# Altium footprint library PcbLib_jp.PcbLib: 255 footprints (part 6 of 16)
Each footprint in its own frame and in the unit in brackets; x right, y up, seen from the top. Pads: shape width x height; smd on the part's side, far side on the other; paste and mask are expansions set on the pad; w line width, h text height; cw(c..) or ccw(c..) is an arc to the next point about the centre after c.
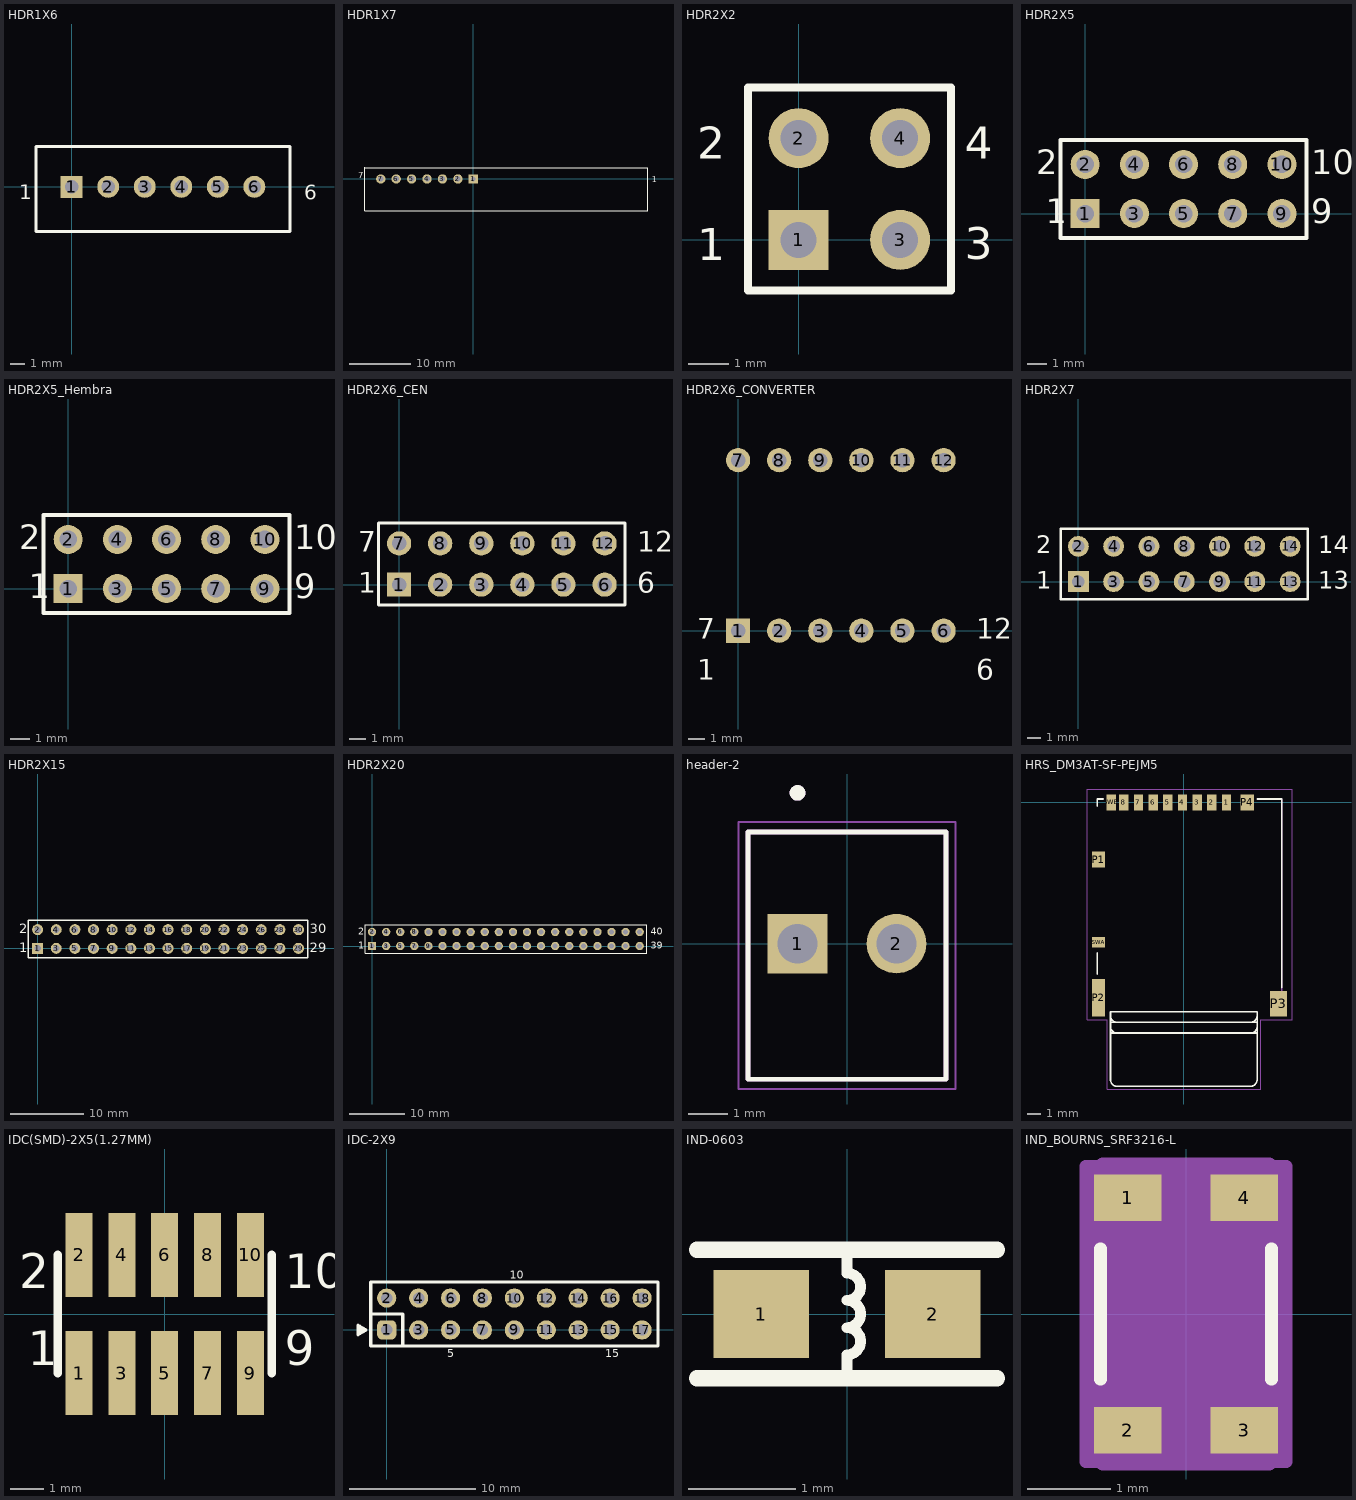
[diagram p5: the footprints below, top view; thin cyan lines are the x and y axes]

## HDR1X6 [mm] "Connector; Header; 6 Position"
pads (6):
  rect 1.5x1.5 hole 0.9: 1(0,0)
  round 1.5 hole 0.9: 2(2.5,0) 3(5,0) 4(7.5,0) 5(10,0) 6(12.5,0)
Top Overlay:
  lines w0.2: -2.449,-3.045 14.95,-3.045 14.95,2.747 -2.449,2.747 -2.449,-3.045
  text "1" at -3.607,-0.864 h1
  text "6" at 15.926,-0.889 h1
3D body "User Library-molex kk 0_1in latching 6 way vertical header.STEP": height 2.64, standoff -12.6, extent -1.321,-2.87 13.919,2.972

## HDR1X7 [mm] "Connector; Header; 6 Position"
pads (7):
  rect 1.524x1.524 hole 0.762: 1(0,0)
  round 1.5 hole 0.9: 2(-2.5,0) 3(-5,0) 4(-7.5,0) 5(-10,0) 6(-12.5,0) 7(-15,0)
Top Overlay:
  lines w0.2: -17.576,1.858 28.332,1.858 28.332,-5.127 -17.576,-5.127 -17.576,1.873
  text "1" at 28.956,-0.559 h1
  text "7" at -18.694,0.127 h1
3D body "User Library-RF receviver.STEP": height 14.7, standoff -1.7, extent -17.591,-4.827 28.129,1.423

## HDR2X2 [mm] "Connector; Header; 2x2 Position"
pads (4):
  rect 1.5x1.5 hole 0.9: 1(0,0)
  round 1.5 hole 0.9: 2(0,2.54) 3(2.54,0) 4(2.54,2.54)
Top Overlay:
  lines w0.2: -1.27,-1.27 3.81,-1.27 3.81,3.81 -1.27,3.81 -1.27,-1.27
  text "3" at 4.16,-0.49 h0.8
  text "4" at 4.16,2.032 h0.8
  text "2" at -2.54,2.032 h0.8
  text "1" at -2.54,-0.508 h0.8
3D body "PPTC022LFBN-RC.STEP": height 8.51, standoff -3.4, extent -1.594,-1.42 3.994,3.66

## HDR2X5 [mm] "Connector; Header; 5x2 Position"
pads (10):
  rect 1.5x1.5 hole 0.9: 1(0,0)
  round 1.5 hole 0.9: 2(0,2.54) 3(2.54,0) 4(2.54,2.54) 5(5.08,0) 6(5.08,2.54) 7(7.62,0) 8(7.62,2.54) 9(10.16,0) 10(10.16,2.54)
Top Overlay:
  lines w0.2: -1.27,-1.27 11.43,-1.27 11.43,3.81 -1.27,3.81 -1.27,-1.27
  text "10" at 11.684,2.032 h1.27
  text "9" at 11.684,-0.508 h1.27
  text "1" at -2.032,-0.508 h1.27
  text "2" at -2.54,2.032 h1.27
3D body "DS1021-2_5SF11--3DModel-STEP-56544.STEP": height 8.6, standoff -3, extent -1.21,-1.23 11.49,3.85

## HDR2X5_Hembra [mm] "Connector; Header; 5x2 Position"
pads (10):
  rect 1.5x1.5 hole 0.9: 1(0,0)
  round 1.5 hole 0.9: 2(0,2.54) 3(2.54,0) 4(2.54,2.54) 5(5.08,0) 6(5.08,2.54) 7(7.62,0) 8(7.62,2.54) 9(10.16,0) 10(10.16,2.54)
Top Overlay:
  lines w0.2: -1.27,-1.27 11.43,-1.27 11.43,3.81 -1.27,3.81 -1.27,-1.27
  text "10" at 11.684,2.032 h1.27
  text "9" at 11.684,-0.508 h1.27
  text "1" at -2.032,-0.508 h1.27
  text "2" at -2.54,2.032 h1.27
3D body "PPTC052LFBN-RC--3DModel-STEP-269445.STEP": height 8.51, standoff -3.4, extent -1.404,-1.22 11.804,3.86

## HDR2X6_CEN [mm] "Connector; Header; 6x2 Position"
pads (12):
  rect 1.5x1.5 hole 0.9: 1(0,0)
  round 1.5 hole 0.9: 2(2.54,0) 3(5.08,0) 4(7.62,0) 5(10.16,0) 6(12.7,0) 7(0,2.54) 8(2.54,2.54) 9(5.08,2.54) 10(7.62,2.54) 11(10.16,2.54) 12(12.7,2.54)
Top Overlay:
  lines w0.2: -1.27,-1.27 13.97,-1.27 13.97,3.81 -1.27,3.81 -1.27,-1.27
  text "12" at 14.732,2.032 h1.27
  text "6" at 14.732,-0.508 h1.27
  text "1" at -2.54,-0.508 h1.27
  text "7" at -2.54,2.032 h1.27

## HDR2X6_CONVERTER [mm] "Arduino Level Convertr"
pads (12):
  rect 1.5x1.5 hole 0.9 square: 1(0,0)
  round 1.5 hole 0.9: 2(2.54,0) 3(5.08,0) 4(7.62,0) 5(10.16,0) 6(12.7,0) 7(0,10.541) 8(2.54,10.541) 9(5.08,10.541) 10(7.62,10.541) 11(10.16,10.541) 12(12.7,10.541)
Top Overlay:
  text "7" at -2.54,-0.508 h1.27
  text "1" at -2.54,-3.048 h1.27
  text "6" at 14.732,-3.048 h1.27
  text "12" at 14.732,-0.508 h1.27
3D body "User Library-LEVEL_CONVERTER_ADAFRUIT.STEP": height 5.46, standoff -6.29, extent -3.912,-2.311 16.538,12.929

## HDR2X7 [mm] "Connector; Header; 7x2 Position"
pads (14):
  rect 1.5x1.5 hole 0.9: 1(0,0)
  round 1.5 hole 0.9: 2(0,2.54) 3(2.54,0) 4(2.54,2.54) 5(5.08,0) 6(5.08,2.54) 7(7.62,0) 8(7.62,2.54) 9(10.16,0) 10(10.16,2.54) 11(12.7,0) 12(12.7,2.54) 13(15.24,0) 14(15.24,2.54)
Top Overlay:
  lines w0.2: -1.27,-1.27 -1.27,3.81 16.51,3.81 16.51,-1.27 -1.27,-1.27
  text "2" at -3.048,2.032 h1.27
  text "1" at -3.048,-0.508 h1.27
  text "14" at 17.272,2.032 h1.27
  text "13" at 17.272,-0.508 h1.27
3D body "42k6788_2-1761603-5.stp": height 10, standoff -1.81, extent -5,-3.11 20.4,6.11

## HDR2X15 [mm] "Connector; Header; 15x2 Position"
pads (30):
  rect 1.5x1.5 hole 0.9: 1(0,0)
  round 1.5 hole 0.9: 2(0,2.54) 3(2.54,0) 4(2.54,2.54) 5(5.08,0) 6(5.08,2.54) 7(7.62,0) 8(7.62,2.54) 9(10.16,0) 10(10.16,2.54) 11(12.7,0) 12(12.7,2.54) 13(15.24,0) 14(15.24,2.54) 15(17.78,0) 16(17.78,2.54) 17(20.32,0) 18(20.32,2.54) 19(22.86,0) 20(22.86,2.54) 21(25.4,0) 22(25.4,2.54) 23(27.94,0) 24(27.94,2.54) 25(30.48,0) 26(30.48,2.54) 27(33.02,0) 28(33.02,2.54) 29(35.56,0) 30(35.56,2.54)
Top Overlay:
  lines w0.2: -1.27,-1.27 -1.27,3.81 36.83,3.81 36.83,-1.27 -1.27,-1.27
  text "30" at 37.084,2.032 h1.27
  text "29" at 37.084,-0.508 h1.27
  text "2" at -2.54,2.032 h1.27
  text "1" at -2.54,-0.508 h1.27
3D body "PPPC152LFBN-RC--3DModel-STEP-56544.STEP": height 8.51, standoff -3.4, extent -1.53,-1.26 37.078,3.82

## HDR2X20 [mm] "Connector; Header; 20x2 Position"
pads (40):
  rect 1.5x1.5 hole 0.9: 1(0,0)
  round 1.5 hole 0.9: 2(0,2.54) 3(2.54,0) 4(2.54,2.54) 5(5.08,0) 6(5.08,2.54) 7(7.62,0) 8(7.62,2.54) 9(10.16,0) 10(10.16,2.54) 11(12.7,0) 12(12.7,2.54) 13(15.24,0) 14(15.24,2.54) 15(17.78,0) 16(17.78,2.54) 17(20.32,0) 18(20.32,2.54) 19(22.86,0) 20(22.86,2.54) 21(25.4,0) 22(25.4,2.54) 23(27.94,0) 24(27.94,2.54) 25(30.48,0) 26(30.48,2.54) 27(33.02,0) 28(33.02,2.54) 29(35.56,0) 30(35.56,2.54) 31(38.1,0) 32(38.1,2.54) 33(40.64,0) 34(40.64,2.54) 35(43.18,0) 36(43.18,2.54) 37(45.72,0) 38(45.72,2.54) 39(48.26,0) 40(48.26,2.54)
Top Overlay:
  lines w0.2: -1.27,-1.27 -1.27,3.81 49.53,3.81 49.53,-1.27 -1.27,-1.27
  text "39" at 50.292,-0.508 h1.27
  text "40" at 50.292,2.032 h1.27
  text "2" at -2.54,2.032 h1.27
  text "1" at -2.54,-0.508 h1.27
3D body "PPTC202LFBN-RC.step": height 8.51, standoff -3.4, extent -1.768,-1.48 49.54,3.6

## header-2 [mm]
pads (2):
  rect 1.53x1.53 hole 1.02: 1(-1.27,0)
  round 1.53 hole 1.02: 2(1.27,0)
Top Overlay:
  circle w0.2: c-1.27,3.87 r0.1
  lines w0.127: -2.54,-3.48 -2.54,2.87 2.54,2.87 2.54,-3.48 -2.54,-3.48
Mechanical 13:
  circle w0.2: c-1.27,3.87 r0.1
  lines w0.127: -2.54,-3.48 -2.54,2.87 2.54,2.87 2.54,-3.48 -2.54,-3.48
Mechanical 15:
  lines w0.05: -2.79,-3.73 -2.79,3.12 2.79,3.12 2.79,-3.73 -2.79,-3.73
3D body "3-647295-2.stp": height 10.37, standoff -3.6, extent -2.642,-3.404 2.438,2.946

## HRS_DM3AT-SF-PEJM5 [mm]
pads (14):
  rect 0.7x1.2 smd: 1(3.2,0) 2(2.1,0) 3(1,0) 4(-0.1,0) 5(-1.2,0) 6(-2.3,0) 7(-3.4,0) 8(-4.5,0) SWB(-5.45,0)
  rect 1x1.2 smd: P1(-6.4,-4.3) P4(4.75,0)
  rect 1x2.8 smd: P2(-6.4,-14.65)
  rect 1.3x1.9 smd: P3(7.1,-15.1)
  rect 1x0.8 smd: SWA(-6.4,-10.5)
Top Overlay:
  lines w0.127: -6.5,-12.9 -6.5,-11.3 ; -6.5,-0.3 -6.5,0.25 -6.05,0.25 ; 5.5,0.25 7.35,0.25 7.35,-13.9 ; -5.5,-17.3 -5,-17.3 ; -5.5,-17.3 -5.5,-16.8 ; -5.5,-17.3 -5.5,-20.8 ccw(c-5,-20.8) -5,-21.3 5,-21.3 ccw(c5,-20.8) 5.5,-20.8 5.5,-17.3 ; -5.5,-16.8 ccw(c-5,-16.8) -5,-17.3 ; -5.5,-16.8 -5.5,-16.5 ; -5.5,-16.5 -5,-16.5 ; -5.5,-16.5 -5.5,-16 ; -5.5,-16 ccw(c-5,-16) -5,-16.5 ; -5.5,-16 -5.5,-15.7 5.5,-15.7 5.5,-16 ; -5,-17.3 5,-17.3 ; -5,-16.5 5,-16.5 ; 5,-17.3 ccw(c5,-16.8) 5.5,-16.8 ; 5,-17.3 5.5,-17.3 ; 5,-16.5 ccw(c5,-16) 5.5,-16 ; 5,-16.5 5.5,-16.5 ; 5.5,-17.3 5.5,-16.8 ; 5.5,-16.8 5.5,-16.5 ; 5.5,-16.5 5.5,-16
Mechanical 13:
  lines w0.127: 7.35,-15.7 7.35,0.25
  text "PCB Edge" at -4.758,-15.525 h0.61
Mechanical 15:
  lines w0.05: -7.25,-16.3 -5.75,-16.3 -5.75,-21.5 5.75,-21.5 5.75,-16.3 8.125,-16.3 8.125,1 -7.25,1 -7.25,-16.3
3D body "DM3AT-SF-PEJM5.stp": height 1.84, standoff 0.16, extent -6.441,-15.949 7.508,0.201

## IDC(SMD)-2X5(1.27MM) [mm]
height 3.9
pads (10):
  rect 0.8x2.5 smd: 1(-2.54,-1.75) 2(-2.54,1.75) 3(-1.27,-1.75) 4(-1.27,1.75) 5(0,-1.75) 6(0,1.75) 7(1.27,-1.75) 8(1.27,1.75) 9(2.54,-1.75) 10(2.54,1.75)
Top Overlay:
  lines w0.254: -3.175,-1.75 -3.175,1.75 ; 3.175,-1.75 3.175,1.75
  text "1" at -4.064,-1.524 h1.02
  text "2" at -4.318,0.762 h1.02
  text "9" at 3.556,-1.524 h1.02
  text "10" at 3.556,0.762 h1.02
3D body "User Library-RM127_10pin_Header.STEP": height 4.46, standoff -0.04, extent -3.175,-2.75 3.175,2.75

## IDC-2X9 [mil]
height 153.54
pads (18):
  rrect50% 60x60 hole 36: 1(0,0)
  round 60 hole 36: 2(0,100) 3(100,0) 4(100,100) 5(200,0) 6(200,100) 7(300,0) 8(300,100) 9(400,0) 10(400,100) 11(500,0) 12(500,100) 13(600,0) 14(600,100) 15(700,0) 16(700,100) 17(800,0) 18(800,100)
Top Overlay:
  lines w10: -75,6 -85,-12 -85,12 -90,15 ; -50,50 50,50 50,-50 ; -90,15 -65,0 -90,-15 -90,15 ; -50,-50 -50,150 850,150 850,-50 -50,-50
  text "10" at 385,160 h25
  text "5" at 190,-85 h25
  text "15" at 685,-85 h25
Bottom Overlay:
  circle w8: c0,0 r39.37
3D body "TPH03-9.STEP": height 336.22, standoff -116.54, extent -48.23,-48.82 851.77,151.18

## IND-0603 [mm] "Inductor 0603(1608)"
height 3.9
pads (2):
  rect 0.89x0.82 smd: 1(-0.8,0) 2(0.8,0)
Top Overlay:
  lines w0.1: 0,-0.6 0,-0.381 ccw(c0,-0.254) 0,-0.127 ccw(c0,0) 0,0.127 ccw(c0,0.254) 0,0.381 0,0.6
  lines w0.15: -1.4,-0.6 1.4,-0.6 ; -1.4,0.6 1.4,0.6
3D body "User Library-Chip InductorINDC1608X95N.STEP": height 0.95, standoff 0, extent -0.8,-0.4 0.8,0.4

## IND_BOURNS_SRF3216-L [mil]
pads (4):
  rect 32x22 smd paste+0 mask+0: 1(-27.5,55) 2(-27.5,-55) 3(27.5,-55) 4(27.5,55)
Top Overlay:
  lines w6: -40.5,-30.9 -40.5,30.9 ; 40.5,-30.9 40.5,30.9
Mechanical 13:
  lines w1: -35.5,-67 35.5,-67 35.5,67 -35.5,67 -35.5,-67
Mechanical 15:
  region: -39.5,-70 -47.5,-70 -47.5,70 -39.5,70 -39.5,71 39.5,71 39.5,70 47.5,70 47.5,-70 39.5,-70 39.5,-71 -39.5,-71
  lines w6: -47.5,-70 -47.5,70 -39.5,70 -39.5,71 39.5,71 39.5,70 47.5,70 47.5,-70 39.5,-70 39.5,-71 -39.5,-71 -39.5,-70 -47.5,-70
3D body "IND_BOURNS_SRF3216.step": height 87.09, standoff 0, extent -35.51,-67.01 35.51,67.01